# Altium footprint library ACTION_IC.PcbLib: 135 footprints (part 2 of 9)
Each footprint in its own frame and in the unit in brackets; x right, y up, seen from the top. Pads: shape width x height; smd on the part's side, far side on the other; paste and mask are expansions set on the pad; w line width, h text height; cw(c..) or ccw(c..) is an arc to the next point about the centre after c.
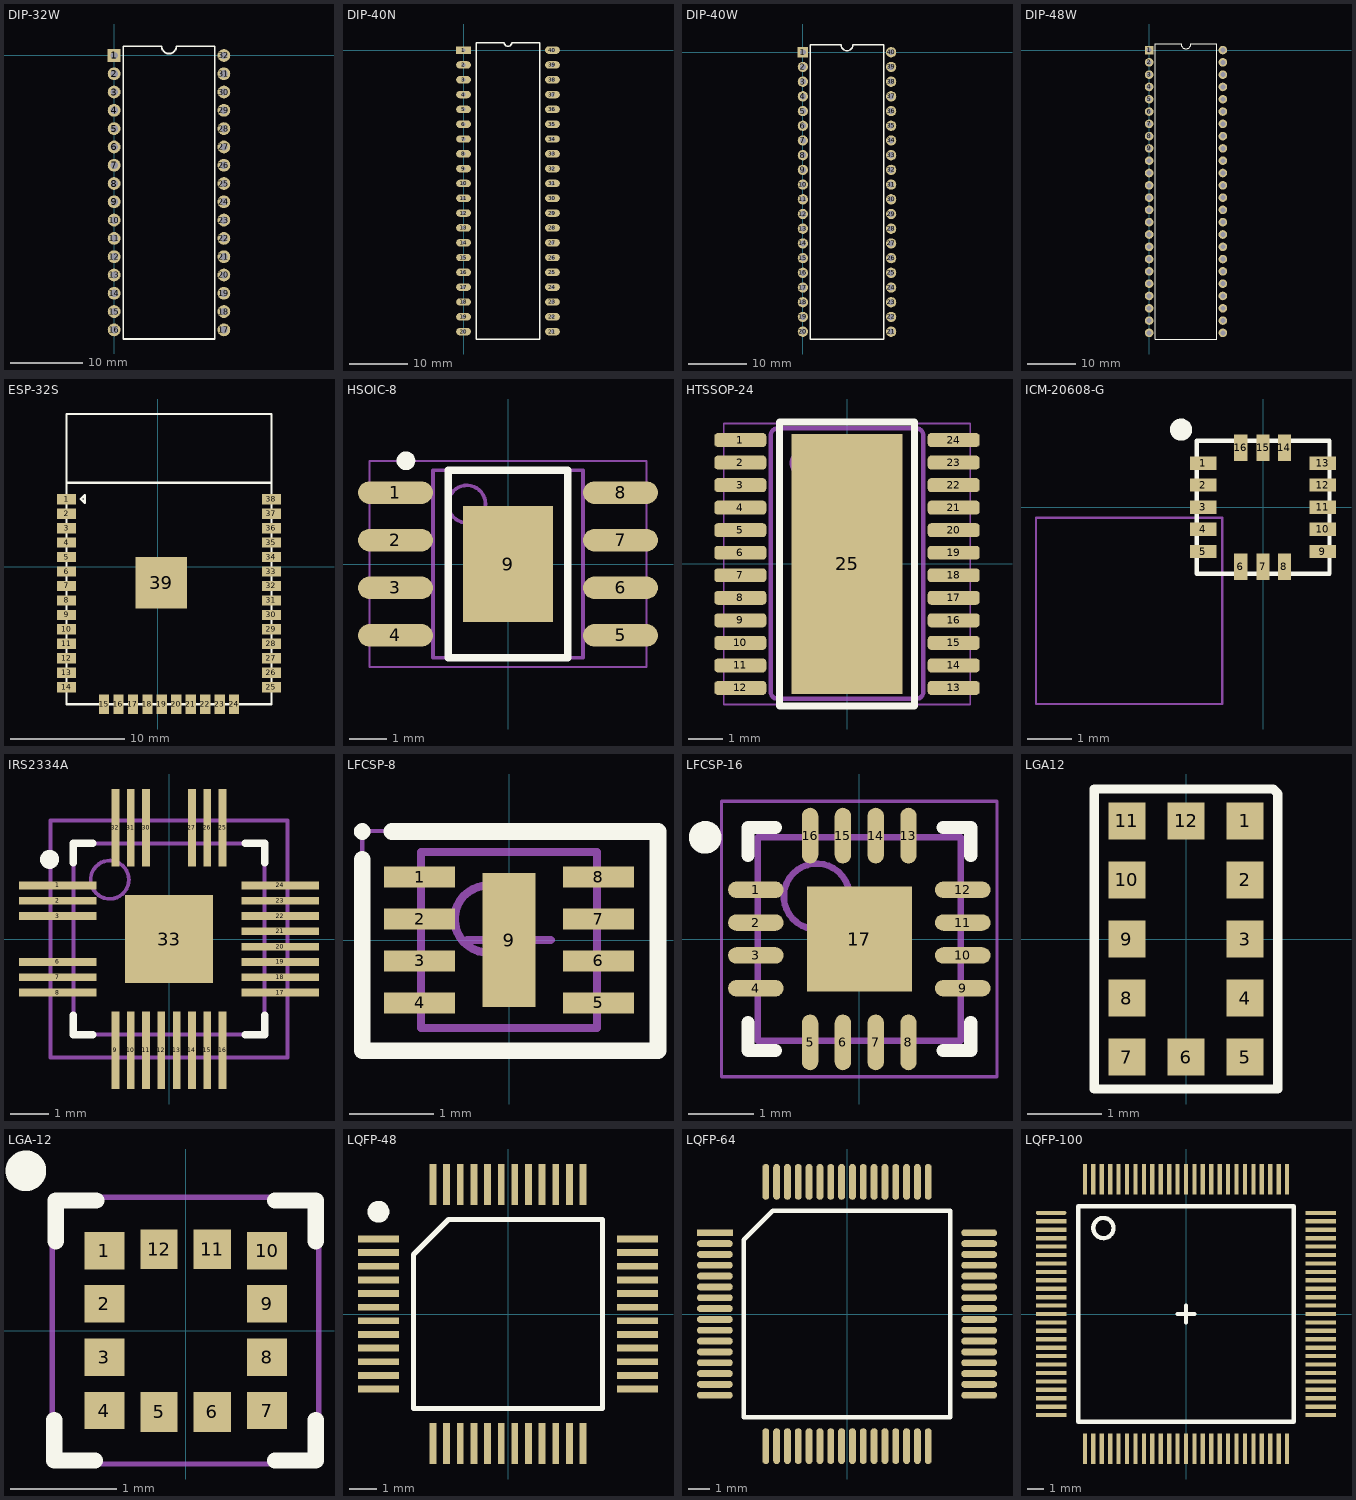
[diagram p1: the footprints below, top view; thin cyan lines are the x and y axes]

## DIP-32W [mil]
pads (32):
  rect 70x70 hole 40: 1(0,0)
  round 70 hole 40: 2(0,-100) 3(0,-200) 4(0,-300) 5(0,-400) 6(0,-500) 7(0,-600) 8(0,-700) 9(0,-800) 10(0,-900) 11(0,-1000) 12(0,-1100) 13(0,-1200) 14(0,-1300) 15(0,-1400) 16(0,-1500) 17(600,-1500) 18(600,-1400) 19(600,-1300) 20(600,-1200) 21(600,-1100) 22(600,-1000) 23(600,-900) 24(600,-800) 25(600,-700) 26(600,-600) 27(600,-500) 28(600,-400) 29(600,-300) 30(600,-200) 31(600,-100) 32(600,0)
Top Overlay:
  lines w10: 50,-1550 50,50 260,50 ccw(c300,50) 340,50 550,50 550,-1550 50,-1550
3D body "SW3DPS-DIP 32 IC WITH 0_380IN WINDOW-DEFAULT.STEP": height 227.95, standoff -129.92, extent -1.91,-1571.56 599.9,83.56

## DIP-40N [mm]
pads (40):
  rect 2.54x1.27 hole 0.635: 1(0,0)
  oval 2.54x1.27 hole 0.635: 2(0,-2.54) 3(0,-5.08) 4(0,-7.62) 5(0,-10.16) 6(0,-12.7) 7(0,-15.24) 8(0,-17.78) 9(0,-20.32) 10(0,-22.86) 11(0,-25.4) 12(0,-27.94) 13(0,-30.48) 14(0,-33.02) 15(0,-35.56) 16(0,-38.1) 17(0,-40.64) 18(0,-43.18) 19(0,-45.72) 20(0,-48.26) 21(15.24,-48.26) 22(15.24,-45.72) 23(15.24,-43.18) 24(15.24,-40.64) 25(15.24,-38.1) 26(15.24,-35.56) 27(15.24,-33.02) 28(15.24,-30.48) 29(15.24,-27.94) 30(15.24,-25.4) 31(15.24,-22.86) 32(15.24,-20.32) 33(15.24,-17.78) 34(15.24,-15.24) 35(15.24,-12.7) 36(15.24,-10.16) 37(15.24,-7.62) 38(15.24,-5.08) 39(15.24,-2.54) 40(15.24,0)
Top Overlay:
  lines w0.254: 2.159,-49.53 13.081,-49.53 13.081,1.27 8.255,1.27 cw(c7.62,1.27) 6.985,1.27 2.159,1.27 2.159,-49.53
3D body "DIP40.STEP": height 5.7, standoff -2.58, extent -0.099,-50.33 15.391,2.12

## DIP-40W [mil]
pads (40):
  rect 70x70 hole 40: 1(0,0)
  round 70 hole 40: 2(0,-100) 3(0,-200) 4(0,-300) 5(0,-400) 6(0,-500) 7(0,-600) 8(0,-700) 9(0,-800) 10(0,-900) 11(0,-1000) 12(0,-1100) 13(0,-1200) 14(0,-1300) 15(0,-1400) 16(0,-1500) 17(0,-1600) 18(0,-1700) 19(0,-1800) 20(0,-1900) 21(600,-1900) 22(600,-1800) 23(600,-1700) 24(600,-1600) 25(600,-1500) 26(600,-1400) 27(600,-1300) 28(600,-1200) 29(600,-1100) 30(600,-1000) 31(600,-900) 32(600,-800) 33(600,-700) 34(600,-600) 35(600,-500) 36(600,-400) 37(600,-300) 38(600,-200) 39(600,-100) 40(600,0)
Top Overlay:
  lines w10: 50,-1950 550,-1950 550,50 340,50 cw(c300,50) 260,50 50,50 50,-1950
3D body "DIP-40.STEP": height 112.6, standoff -176.97, extent -1.7,-1973.74 609.72,83.74

## DIP-48W [mil]
pads (48):
  rect 70x70 hole 40: 1(0,0)
  round 70 hole 40: 2(0,-100) 3(0,-200) 4(0,-300) 5(0,-400) 6(0,-500) 7(0,-600) 8(0,-700) 9(0,-800) 10(0,-900) 11(0,-1000) 12(0,-1100) 13(0,-1200) 14(0,-1300) 15(0,-1400) 16(0,-1500) 17(0,-1600) 18(0,-1700) 19(0,-1800) 20(0,-1900) 21(0,-2000) 22(0,-2100) 23(0,-2200) 24(0,-2300) 25(600,-2300) 26(600,-2200) 27(600,-2100) 28(600,-2000) 29(600,-1900) 30(600,-1800) 31(600,-1700) 32(600,-1600) 33(600,-1500) 34(600,-1400) 35(600,-1300) 36(600,-1200) 37(600,-1100) 38(600,-1000) 39(600,-900) 40(600,-800) 41(600,-700) 42(600,-600) 43(600,-500) 44(600,-400) 45(600,-300) 46(600,-200) 47(600,-100) 48(600,0)
Top Overlay:
  lines w10: 50,-2350 550,-2350 550,50 340,50 cw(c300,50) 260,50 50,50 50,-2350
3D body "DIP48.STEP": height 183.46, standoff -129.13, extent 1.52,-2365.87 616.48,55

## ESP-32S [mm]
pads (39):
  rect 1.7x0.9 smd: 1(-8.009,5.937) 2(-8.009,4.667) 3(-8.009,3.397) 4(-8.009,2.127) 5(-8.009,0.857) 6(-8.009,-0.413) 7(-8.009,-1.683) 8(-8.009,-2.953) 9(-8.009,-4.223) 10(-8.009,-5.493) 11(-8.009,-6.763) 12(-8.009,-8.033) 13(-8.009,-9.303) 14(-8.009,-10.573) 25(9.991,-10.573) 26(9.991,-9.303) 27(9.991,-8.033) 28(9.991,-6.763) 29(9.991,-5.493) 30(9.991,-4.223) 31(9.991,-2.953) 32(9.991,-1.683) 33(9.991,-0.413) 34(9.991,0.857) 35(9.991,2.127) 36(9.991,3.397) 37(9.991,4.667) 38(9.991,5.937)
  rect 0.9x1.7 smd: 15(-4.719,-12.083) 16(-3.449,-12.083) 17(-2.179,-12.083) 18(-0.909,-12.083) 19(0.361,-12.083) 20(1.631,-12.083) 21(2.901,-12.083) 22(4.171,-12.083) 23(5.441,-12.083) 24(6.711,-12.083)
  rect 4.5x4.5 smd: 39(0.311,-1.403)
Top Overlay:
  lines w0.2: -8.009,7.377 9.991,7.377 ; -8.009,-12.073 9.991,-12.073 9.991,13.427 -8.009,13.427 -8.009,-12.073 ; -6.759,5.957 -6.409,6.307 -6.409,5.607 -6.759,5.957

## HSOIC-8 [mm]
height 1.7
pads (9):
  oval 2x0.6 smd: 1(-3.004,1.905) 2(-3.004,0.635) 3(-3.004,-0.635) 4(-3.004,-1.905) 5(3.004,-1.905) 6(3.004,-0.635) 7(3.004,0.635) 8(3.004,1.905)
  rect 2.4x3.1 smd: 9(0,0)
Top Overlay:
  circle w0.25: c-2.725,2.755 r0.125
  lines w0.2: -1.6,-2.5 -1.6,2.5 1.6,2.5 1.6,-2.5 -1.6,-2.5
Mechanical 13:
  circle w0.1: c-1.1,1.6 r0.5
  lines w0.1: -2,-2.5 -2,2.5 2,2.5 2,-2.5 -2,-2.5
Mechanical 15:
  lines w0.05: -3.7,-2.75 -3.7,2.75 3.7,2.75 3.7,-2.75 -3.7,-2.75
  lines w0.1: -0.5,0 0.5,0 ; 0,-0.5 0,0.5
3D body "User Library-sop-8.STEP": height 1.6, standoff 0, extent -3.021,-2.51 3.021,2.51

## HTSSOP-24 [mm]
pads (25):
  rrect50% 1.5x0.4 smd paste+0 mask+0.051: 1(-3.076,3.575) 2(-3.076,2.925) 3(-3.076,2.275) 4(-3.076,1.625) 5(-3.076,0.975) 6(-3.076,0.325) 7(-3.076,-0.325) 8(-3.076,-0.975) 9(-3.076,-1.625) 10(-3.076,-2.275) 11(-3.076,-2.925) 12(-3.076,-3.575) 13(3.076,-3.575) 14(3.076,-2.925) 15(3.076,-2.275) 16(3.076,-1.625) 17(3.076,-0.975) 18(3.076,-0.325) 19(3.076,0.325) 20(3.076,0.975) 21(3.076,1.625) 22(3.076,2.275) 23(3.076,2.925) 24(3.076,3.575)
  rect 3.2x7.5 smd paste-3.887 mask-3.886: 25(0,0)
Top Overlay:
  lines w0.2: -1.95,-4.1 1.95,-4.1 1.95,4.1 -1.95,4.1 -1.95,-4.1
Top Paste:
  region: 1.587,-2.629 1.577,-2.63 -1.527,-2.63 -1.536,-2.629 -1.545,-2.626 -1.553,-2.622 -1.561,-2.616 -1.567,-2.609 -1.571,-2.6 -1.574,-2.591 -1.575,-2.582 -1.575,2.582 -1.574,2.591 -1.571,2.6 -1.567,2.609 -1.561,2.616 -1.553,2.622 -1.545,2.626 -1.536,2.629 -1.527,2.63 1.577,2.63 1.587,2.629 1.596,2.626 1.604,2.622 1.611,2.616 1.617,2.609 1.622,2.6 1.624,2.591 1.625,2.582 1.625,-2.582 1.624,-2.591 1.622,-2.6 1.617,-2.609 1.611,-2.616 1.604,-2.622 1.596,-2.626
Top Solder:
  region: 1.587,-2.629 1.577,-2.63 -1.527,-2.63 -1.536,-2.629 -1.545,-2.626 -1.553,-2.622 -1.561,-2.616 -1.567,-2.609 -1.571,-2.6 -1.574,-2.591 -1.575,-2.582 -1.575,2.582 -1.574,2.591 -1.571,2.6 -1.567,2.609 -1.561,2.616 -1.553,2.622 -1.545,2.626 -1.536,2.629 -1.527,2.63 1.577,2.63 1.587,2.629 1.596,2.626 1.604,2.622 1.611,2.616 1.617,2.609 1.622,2.6 1.624,2.591 1.625,2.582 1.625,-2.582 1.624,-2.591 1.622,-2.6 1.617,-2.609 1.611,-2.616 1.604,-2.622 1.596,-2.626
Mechanical 13:
  lines w0.127: -2.2,-3.689 ccw(c-2,-3.689) -2,-3.889 2,-3.889 ccw(c2,-3.689) 2.2,-3.689 2.2,3.711 ccw(c2,3.711) 2,3.911 -2,3.911 ccw(c-2,3.711) -2.2,3.711 -2.2,-3.689 ; -1.19,2.511 cw(c-1.19,2.911) -1.19,3.311 cw(c-1.19,2.911) -1.19,2.511
Mechanical 15:
  lines w0.05: -3.55,-4.05 -3.55,4.05 3.55,4.05 3.55,-4.05 -3.55,-4.05
  lines w0.1: -0.5,0 0.5,0 ; 0,-0.5 0,0.5
3D body "PWP0024M.stp": height 1.13, standoff 0, extent -3.2,-3.9 3.2,3.9

## ICM-20608-G [mm] "ICM-20608-G"
height 0.86
pads (16):
  rect 0.6x0.3 smd: 1(-1.346,0.991) 2(-1.346,0.5) 3(-1.346,0) 4(-1.346,-0.5) 5(-1.346,-1) 9(1.346,-1) 10(1.346,-0.5) 11(1.346,0) 12(1.346,0.5) 13(1.346,0.991)
  rect 0.3x0.6 smd: 6(-0.5,-1.346) 7(0,-1.346) 8(0.483,-1.346) 14(0.483,1.346) 15(0,1.346) 16(-0.5,1.346)
Top Overlay:
  circle w0.25: c-1.85,1.75 r0.125
  lines w0.1: -1.5,-1.5 1.5,-1.5 1.5,1.5 -1.5,1.5 -1.5,-1.5
Mechanical 20:
  lines w0.05: -5.123,-4.437 -5.123,-0.237 -0.923,-0.237 -0.923,-4.437 -5.123,-4.437
3D body "ICM-20602.stp": height 0.8, standoff 0, extent -1.55,-1.576 1.55,1.524

## IRS2334A [mm] "irs2334"
height 1
pads (29):
  rect 2.032x0.2 smd: 1(-2.906,1.4) 2(-2.906,1) 3(-2.906,0.6) 6(-2.906,-0.6) 7(-2.906,-1) 8(-2.906,-1.4) 17(2.906,-1.4) 18(2.906,-1) 19(2.906,-0.6) 20(2.906,-0.2) 21(2.906,0.2) 22(2.906,0.6) 23(2.906,1) 24(2.906,1.4)
  rect 0.2x2.032 smd: 9(-1.4,-2.906) 10(-1,-2.906) 11(-0.6,-2.906) 12(-0.2,-2.906) 13(0.2,-2.906) 14(0.6,-2.906) 15(1,-2.906) 16(1.4,-2.906) 25(1.4,2.906) 26(1,2.906) 27(0.6,2.906) 30(-0.6,2.906) 31(-1,2.906) 32(-1.4,2.906)
  rect 2.3x2.3 smd: 33(0,0)
Top Overlay:
  circle w0.25: c-3.122,2.083 r0.125
  lines w0.2: -2.5,-2 -2.5,-2.5 -2,-2.5 ; -2.5,2 -2.5,2.5 -2,2.5 ; 2,-2.5 2.5,-2.5 2.5,-2 ; 2,2.5 2.5,2.5 2.5,2
Mechanical 13:
  circle w0.1: c-1.55,1.55 r0.5
  lines w0.1: -2.5,-2.5 -2.5,2.5 2.5,2.5 2.5,-2.5 -2.5,-2.5
Mechanical 15:
  lines w0.1: -0.5,0 0.5,0 ; 0,-0.5 0,0.5 ; -3.1,-3.1 -3.1,3.1 3.1,3.1 3.1,-3.1 -3.1,-3.1
3D body: height 1, standoff 0.02, extent -2.5,-2.5 2.5,2.5

## LFCSP-8 [mm]
height 0.6
pads (9):
  rect 0.85x0.25 smd: 1(-1.067,0.75) 2(-1.067,0.25) 3(-1.067,-0.25) 4(-1.067,-0.75) 5(1.067,-0.75) 6(1.067,-0.25) 7(1.067,0.25) 8(1.067,0.75)
  rect 0.63x1.6 smd: 9(0,0)
Top Overlay:
  circle w0.1: c-1.753,1.295 r0.05
  lines w0.2: -1.753,0.965 -1.753,-1.321 1.778,-1.321 1.778,1.295 -1.397,1.295
Mechanical 13:
  circle w0.1: c-0.25,0.25 r0.4
  lines w0.1: -1.05,-1.05 1.05,-1.05 1.05,1.05 -1.05,1.05 -1.05,-1.05
Mechanical 15:
  lines w0.05: -1.753,-1.3 1.778,-1.3 1.778,1.3 -1.753,1.3 -1.753,-1.3
  lines w0.1: -0.5,0 0.5,0 ; 0,-0.5 0,0.5
3D body: height 0.6, standoff 0.05, extent -1.05,-1.05 1.05,1.05

## LFCSP-16 [mm]
height 0.8
pads (17):
  oval 0.85x0.25 smd: 1(-1.577,0.75) 2(-1.577,0.25) 3(-1.577,-0.25) 4(-1.577,-0.75) 9(1.577,-0.75) 10(1.577,-0.25) 11(1.577,0.25) 12(1.577,0.75)
  oval 0.25x0.85 smd: 5(-0.75,-1.577) 6(-0.25,-1.577) 7(0.25,-1.577) 8(0.75,-1.577) 13(0.75,1.577) 14(0.25,1.577) 15(-0.25,1.577) 16(-0.75,1.577)
  rect 1.6x1.6 smd: 17(0,0)
Top Overlay:
  circle w0.25: c-2.35,1.55 r0.125
  lines w0.2: -1.7,-1.275 -1.7,-1.7 -1.275,-1.7 ; -1.7,1.275 -1.7,1.7 -1.275,1.7 ; 1.275,-1.7 1.7,-1.7 1.7,-1.275 ; 1.275,1.7 1.7,1.7 1.7,1.275
Mechanical 13:
  circle w0.1: c-0.65,0.65 r0.5
  lines w0.1: -1.55,-1.55 -1.55,1.55 1.55,1.55 1.55,-1.55 -1.55,-1.55
Mechanical 15:
  lines w0.05: -2.1,-2.1 -2.1,2.1 2.1,2.1 2.1,-2.1 -2.1,-2.1
  lines w0.1: -0.5,0 0.5,0 ; 0,-0.5 0,0.5
3D body "LFCSP-16.step": height 0.8, standoff 0, extent -1.57,-1.57 1.57,1.57

## LGA12 [mm]
pads (12):
  rect 0.5x0.5 smd: 1(0.8,1.6) 2(0.8,0.8) 3(0.8,0) 4(0.8,-0.8) 5(0.8,-1.6) 6(0,-1.6) 7(-0.8,-1.6) 8(-0.8,-0.8) 9(-0.8,0) 10(-0.8,0.8) 11(-0.8,1.6) 12(0,1.6)
Top Overlay:
  lines w0.127: -1.245,-2.032 -1.245,2.032 1.181,2.032 1.245,1.968 1.245,-2.032 -1.245,-2.032
3D body: height 1.05, standoff 0, extent -1.168,-1.956 1.143,1.956

## LGA-12 [mm]
pads (12):
  rect 0.375x0.35 smd: 1(-0.763,0.75) 2(-0.763,0.25) 3(-0.763,-0.25) 4(-0.763,-0.75) 7(0.763,-0.75) 8(0.763,-0.25) 9(0.763,0.25) 10(0.763,0.75)
  rect 0.35x0.375 smd: 5(-0.25,-0.762) 6(0.25,-0.762) 11(0.25,0.763) 12(-0.25,0.763)
Top Overlay:
  circle w0.254: c-1.499,1.499 r0.064
  lines w0.152: -1.232,-0.838 -1.232,-1.219 -0.851,-1.219 ; -1.219,0.838 -1.219,1.219 -0.838,1.219 ; 0.838,-1.219 1.219,-1.219 1.219,-0.838 ; 0.838,1.219 1.219,1.219 1.219,0.838
Mechanical 3:
  lines w0.05: -1.25,-1.251 1.249,-1.251 1.249,1.251 -1.25,1.251 -1.25,-1.251
3D body "User Library-lga-2x2x0_9.STEP": height 0.95, standoff 0, extent -1,-1 1,1

## LQFP-48 [mm]
pads (48):
  rect 1.5x0.25 smd: 1(-4.75,2.75) 2(-4.75,2.25) 3(-4.75,1.75) 4(-4.75,1.25) 5(-4.75,0.75) 6(-4.75,0.25) 7(-4.75,-0.25) 8(-4.75,-0.75) 9(-4.75,-1.25) 10(-4.75,-1.75) 11(-4.75,-2.25) 12(-4.75,-2.75) 25(4.75,-2.75) 26(4.75,-2.25) 27(4.75,-1.75) 28(4.75,-1.25) 29(4.75,-0.75) 30(4.75,-0.25) 31(4.75,0.25) 32(4.75,0.75) 33(4.75,1.25) 34(4.75,1.75) 35(4.75,2.25) 36(4.75,2.75)
  rect 0.25x1.5 smd: 13(-2.75,-4.75) 14(-2.25,-4.75) 15(-1.75,-4.75) 16(-1.25,-4.75) 17(-0.75,-4.75) 18(-0.25,-4.75) 19(0.25,-4.75) 20(0.75,-4.75) 21(1.25,-4.75) 22(1.75,-4.75) 23(2.25,-4.75) 24(2.75,-4.75) 37(2.75,4.75) 38(2.25,4.75) 39(1.75,4.75) 40(1.25,4.75) 41(0.75,4.75) 42(0.25,4.75) 43(-0.25,4.75) 44(-0.75,4.75) 45(-1.25,4.75) 46(-1.75,4.75) 47(-2.25,4.75) 48(-2.75,4.75)
Top Overlay:
  circle w0.4: c-4.75,3.75 r0.2
  lines w0.2: -3.465,-3.465 3.465,-3.465 3.465,3.465 -2.18,3.465 -3.465,2.18 -3.465,-3.465
3D body "LQFP7X7-48.STEP": height 1.56, standoff 0, extent -4.525,-4.48 4.474,4.52

## LQFP-64 [mm]
pads (64):
  rect 1.651x0.32 smd: 1(-6.1,3.75)
  oval 1.651x0.32 smd: 2(-6.1,3.25) 3(-6.1,2.75) 4(-6.1,2.25) 5(-6.1,1.75) 6(-6.1,1.25) 7(-6.1,0.75) 8(-6.1,0.25) 9(-6.1,-0.25) 10(-6.1,-0.75) 11(-6.1,-1.25) 12(-6.1,-1.75) 13(-6.1,-2.25) 14(-6.1,-2.75) 15(-6.1,-3.25) 16(-6.1,-3.75) 33(6.1,-3.75) 34(6.1,-3.25) 35(6.1,-2.75) 36(6.1,-2.25) 37(6.1,-1.75) 38(6.1,-1.25) 39(6.1,-0.75) 40(6.1,-0.25) 41(6.1,0.25) 42(6.1,0.75) 43(6.1,1.25) 44(6.1,1.75) 45(6.1,2.25) 46(6.1,2.75) 47(6.1,3.25) 48(6.1,3.75)
  oval 0.32x1.651 smd: 17(-3.75,-6.1) 18(-3.25,-6.1) 19(-2.75,-6.1) 20(-2.25,-6.1) 21(-1.75,-6.1) 22(-1.25,-6.1) 23(-0.75,-6.1) 24(-0.25,-6.1) 25(0.25,-6.1) 26(0.75,-6.1) 27(1.25,-6.1) 28(1.75,-6.1) 29(2.25,-6.1) 30(2.75,-6.1) 31(3.25,-6.1) 32(3.75,-6.1) 49(3.75,6.1) 50(3.25,6.1) 51(2.75,6.1) 52(2.25,6.1) 53(1.75,6.1) 54(1.25,6.1) 55(0.75,6.1) 56(0.25,6.1) 57(-0.25,6.1) 58(-0.75,6.1) 59(-1.25,6.1) 60(-1.75,6.1) 61(-2.25,6.1) 62(-2.75,6.1) 63(-3.25,6.1) 64(-3.75,6.1)
Top Overlay:
  lines w0.2: -4.765,-4.765 4.765,-4.765 4.765,4.765 -3.43,4.765 -4.765,3.43 -4.765,-4.765
3D body "LQFP-64.STEP": height 1.6, standoff 0, extent -5.949,-6 6.051,6

## LQFP-100 [mm]
pads (100):
  oval 1.8x0.25 smd: 1(-8,6)
  rect 1.8x0.25 smd: 2(-8,5.5) 3(-8,5) 4(-8,4.5) 5(-8,4) 6(-8,3.5) 7(-8,3) 8(-8,2.5) 9(-8,2) 10(-8,1.5) 11(-8,1) 12(-8,0.5) 13(-8,0) 14(-8,-0.5) 15(-8,-1) 16(-8,-1.5) 17(-8,-2) 18(-8,-2.5) 19(-8,-3) 20(-8,-3.5) 21(-8,-4) 22(-8,-4.5) 23(-8,-5) 24(-8,-5.5) 25(-8,-6) 51(8,-6) 52(8,-5.5) 53(8,-5) 54(8,-4.5) 55(8,-4) 56(8,-3.5) 57(8,-3) 58(8,-2.5) 59(8,-2) 60(8,-1.5) 61(8,-1) 62(8,-0.5) 63(8,0) 64(8,0.5) 65(8,1) 66(8,1.5) 67(8,2) 68(8,2.5) 69(8,3) 70(8,3.5) 71(8,4) 72(8,4.5) 73(8,5) 74(8,5.5) 75(8,6)
  rect 0.25x1.8 smd: 26(-6,-8) 27(-5.5,-8) 28(-5,-8) 29(-4.5,-8) 30(-4,-8) 31(-3.5,-8) 32(-3,-8) 33(-2.5,-8) 34(-2,-8) 35(-1.5,-8) 36(-1,-8) 37(-0.5,-8) 38(0,-8) 39(0.5,-8) 40(1,-8) 41(1.5,-8) 42(2,-8) 43(2.5,-8) 44(3,-8) 45(3.5,-8) 46(4,-8) 47(4.5,-8) 48(5,-8) 49(5.5,-8) 50(6,-8) 76(6,8) 77(5.5,8) 78(5,8) 79(4.5,8) 80(4,8) 81(3.5,8) 82(3,8) 83(2.5,8) 84(2,8) 85(1.5,8) 86(1,8) 87(0.5,8) 88(0,8) 89(-0.5,8) 90(-1,8) 91(-1.5,8) 92(-2,8) 93(-2.5,8) 94(-3,8) 95(-3.5,8) 96(-4,8) 97(-4.5,8) 98(-5,8) 99(-5.5,8) 100(-6,8)
Top Overlay:
  circle w0.254: c-4.9,5.1 r0.6
  lines w0.254: -0.5,0 0.5,0 ; 0,-0.5 0,0.5 ; -6.4,-6.4 6.4,-6.4 6.4,6.4 -6.4,6.4 -6.4,-6.4
3D body "LQFP-100.STEP": height 1.6, standoff 0, extent -7.97,-7.969 8.03,8.031